# Altium footprint library lib_common.PcbLib: 13 footprints
Each footprint in its own frame and in the unit in brackets; x right, y up, seen from the top. Pads: shape width x height; smd on the part's side, far side on the other; paste and mask are expansions set on the pad; w line width, h text height; cw(c..) or ccw(c..) is an arc to the next point about the centre after c.
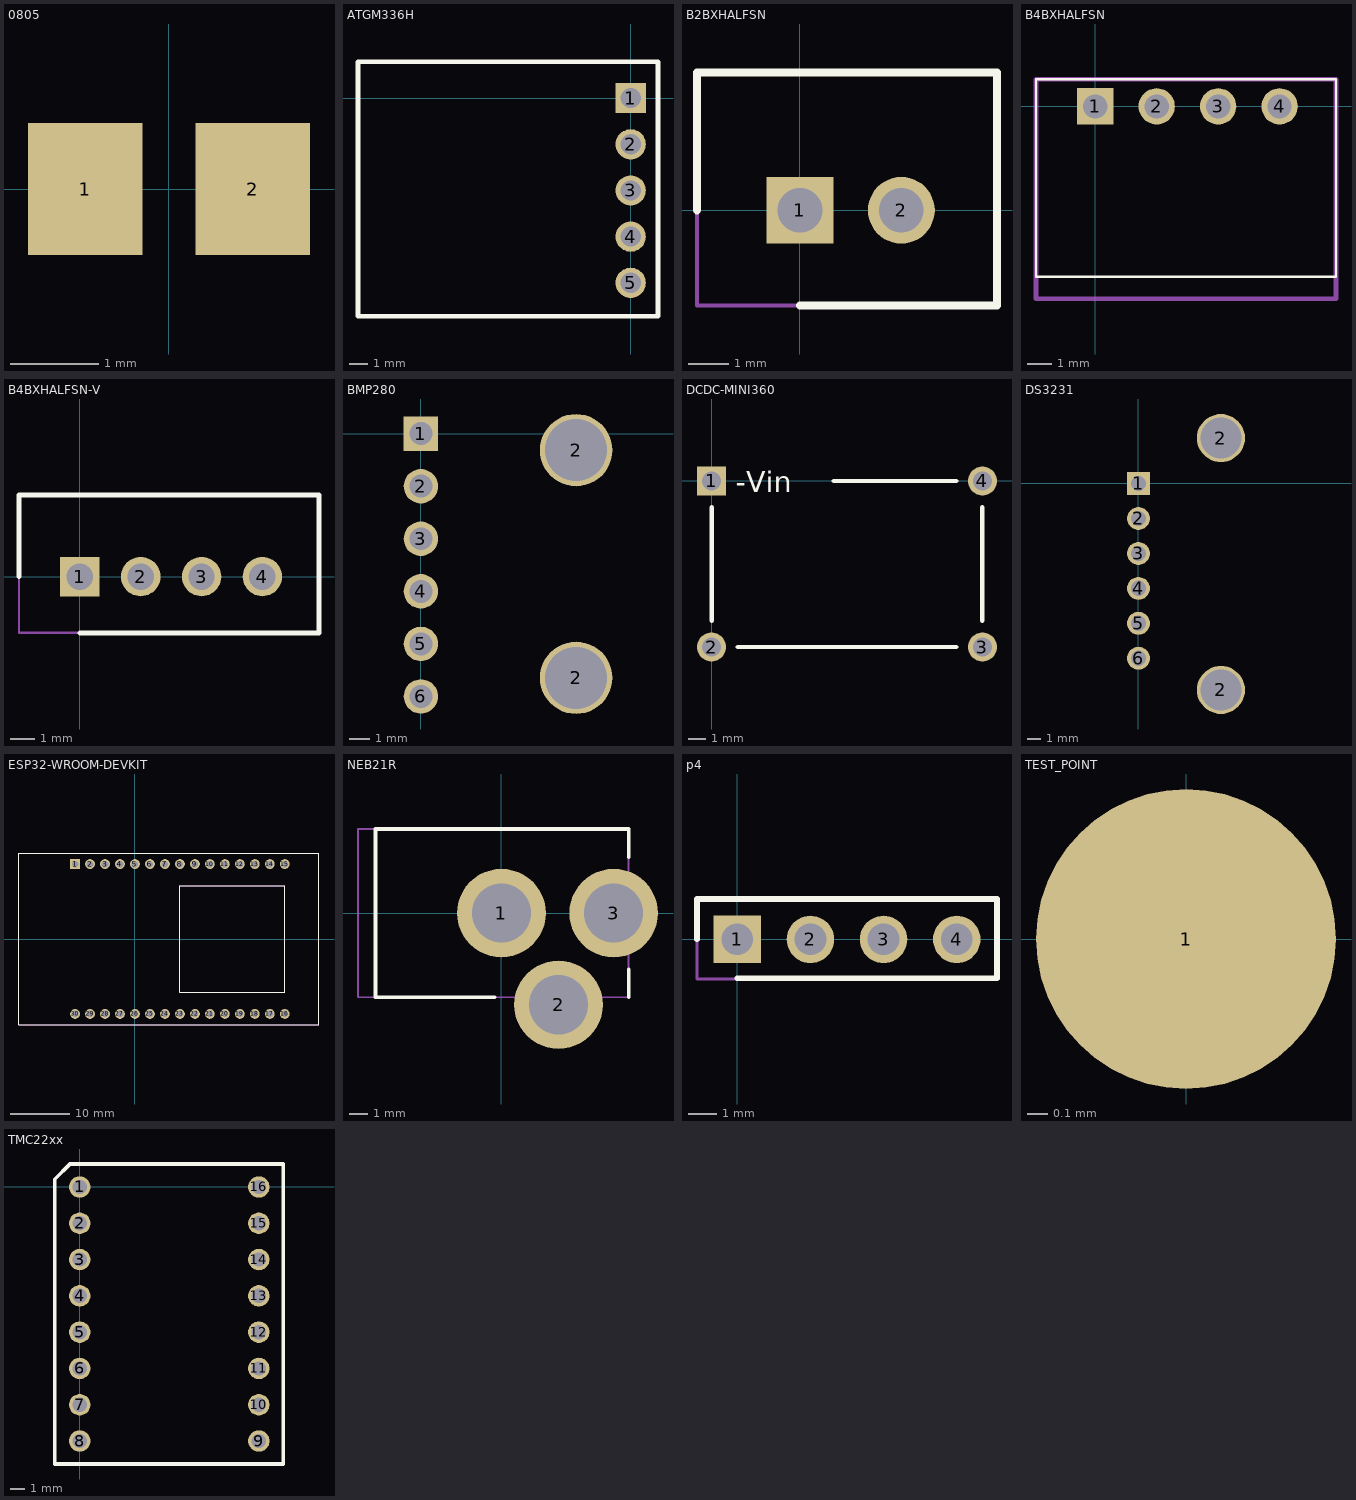
[diagram p0: the footprints below, top view; thin cyan lines are the x and y axes]

## 0805 [mm] "Chip Resistor; Body 2.0 x 1.3 mm (LxW typ)"
height 2.54
pads (2):
  rect 1.3x1.5 smd: 1(-0.95,0) 2(0.95,0)
3D body "User Library-RES_2013-0805.step": height 0.76, standoff 0, extent -1.15,-0.65 1.15,0.701

## ATGM336H [mm]
pads (5):
  rect 1.665x1.665 hole 1.11: 1(0,0)
  round 1.665 hole 1.11: 2(0,-2.54) 3(0,-5.08) 4(0,-7.62) 5(0,-10.16)
Top Overlay:
  lines w0.254: -15,-12 -15,2 1.5,2 1.5,-12 -15,-12

## B2BXHALFSN [mm]
pads (2):
  rect 1.65x1.65 hole 1.1: 1(0,0)
  round 1.65 hole 1.1: 2(2.5,0)
Top Overlay:
  lines w0.2: -2.54,0 -2.54,3.4 4.86,3.4 4.86,-2.35 0,-2.35
Mechanical 13:
  lines w0.1: -2.54,-2.35 4.86,-2.35 4.86,3.4 -2.54,3.4 -2.54,-2.35
3D body "B2B-XH-A_LF__SN_.stp": height 7, standoff -3.4, extent -2.54,-2.35 4.86,3.4

## B4BXHALFSN [mm]
pads (4):
  rect 1.5x1.5 hole 1: 1(0,0)
  round 1.5 hole 1: 2(2.54,0) 3(5.08,0) 4(7.62,0)
Top Overlay:
  lines w0.1: -2.45,-7.036 9.95,-7.036 9.95,1.118 -2.45,1.118 -2.45,-7.036
Mechanical 13:
  lines w0.2: -2.45,-7.95 9.95,-7.95 9.95,1.118 -2.45,1.118 -2.45,-7.95
3D body "JST - XH - Thru R - 4Pin - 2.54mm.stp": height 5.84, standoff -3.38, extent -2.388,-7.737 9.906,0.3

## B4BXHALFSN-V [mm]
pads (4):
  rect 1.65x1.65 hole 1.1: 1(0,0)
  round 1.65 hole 1.1: 2(2.54,0) 3(5.08,0) 4(7.62,0)
Top Overlay:
  lines w0.2: -2.54,0 -2.54,3.4 9.982,3.4 9.982,-2.35 0,-2.35
Mechanical 13:
  lines w0.1: -2.54,-2.35 9.982,-2.35 9.982,3.4 -2.54,3.4 -2.54,-2.35
3D body "B4B-XH-A.STEP": height 7, standoff -3.4, extent -2.466,-2.321 9.934,3.429

## BMP280 [mm]
pads (8):
  rect 1.665x1.665 hole 1.11: 1(0,0)
  round 1.665 hole 1.11: 2(0,-2.54) 3(0,-5.08) 4(0,-7.62) 5(0,-10.16) 6(0,-12.7)
  round 3.5 hole 3: 2(7.5,-11.8) 2(7.5,-0.8)
3D body "bmp280_module.stp": height 6.07, standoff -6.63, extent -1.444,-13.924 9.556,1.316

## DCDC-MINI360 [mm]
pads (4):
  rect 1.665x1.665 hole 1.11: 1(0,0)
  round 1.665 hole 1.11: 2(0,-9.5) 3(15.5,-9.5) 4(15.5,0)
Top Overlay:
  lines w0.254: 0,-8 0,-1.5 ; 1.5,-9.5 14,-9.5 ; 7,0 14,0 ; 15.5,-8 15.5,-1.5
  text "-Vin" at 1.372,-0.635 h1.2
3D body "dsn-mini-360.step": height 7.2, standoff -4.83, extent -1.228,-10.549 16.772,1.101

## DS3231 [mm]
pads (8):
  rect 1.665x1.665 hole 1.11: 1(0,0)
  round 1.665 hole 1.11: 2(0,-2.54) 3(0,-5.08) 4(0,-7.62) 5(0,-10.16) 6(0,-12.7)
  round 3.5 hole 3: 2(6,-15) 2(6,3.3)
3D body "DS3231_HW_84.step": height 13.15, standoff 0.1, extent -2.007,-17.451 35.993,4.7

## ESP32-WROOM-DEVKIT [mm]
pads (30):
  rect 1.665x1.665 hole 1.11: 1(-10.16,12.7)
  round 1.665 hole 1.11: 2(-7.62,12.7) 3(-5.08,12.7) 4(-2.54,12.7) 5(0,12.7) 6(2.54,12.7) 7(5.08,12.7) 8(7.62,12.7) 9(10.16,12.7) 10(12.7,12.7) 11(15.24,12.7) 12(17.78,12.7) 13(20.32,12.7) 14(22.86,12.7) 15(25.4,12.7) 16(25.4,-12.7) 17(22.86,-12.7) 18(20.32,-12.7) 19(17.78,-12.7) 20(15.24,-12.7) 21(12.7,-12.7) 22(10.16,-12.7) 23(7.62,-12.7) 24(5.08,-12.7) 25(2.54,-12.7) 26(0,-12.7) 27(-2.54,-12.7) 28(-5.08,-12.7) 29(-7.62,-12.7) 30(-10.16,-12.7)
Top Overlay:
  lines w0.1: -19.66,-14.5 -19.66,14.5 31.2,14.5 31.2,-14.5 -19.66,-14.5
  lines w0.2: 7.62,-9 25.4,-9 25.4,9 7.62,9 7.62,-9
Mechanical 13:
  lines w0.2: -19.66,-14.5 -19.66,14.5 31.2,14.5 31.2,-14.5 -19.66,-14.5 ; 7.62,-9 25.4,-9 25.4,9 7.62,9 7.62,-9
3D body "ESP-WROOM32.STEP": height 6.8, standoff -5.6, extent -20.055,-14.199 30.875,14.301

## NEB21R [mm]
pads (3):
  round 4.74 hole 3.16: 1(0,0) 2(3.05,-4.9) 3(6,0)
Top Overlay:
  lines w0.2: -6.731,-4.5 -6.731,4.496 6.8,4.496 ; -6.731,-4.496 -0.356,-4.496 ; 6.8,-4.5 6.8,-3 ; 6.8,3 6.8,4.5
Mechanical 13:
  lines w0.1: -7.671,-4.5 6.8,-4.5 6.8,4.5 -7.671,4.5 -7.671,-4.5
3D body "JACK ALIM.STEP": height 10.8, standoff -3.6, extent -7.391,-5.129 7.259,4.571

## p4 [mm]
pads (4):
  rect 1.65x1.65 hole 1.1: 1(0,0)
  round 1.65 hole 1.1: 2(2.54,0) 3(5.08,0) 4(7.62,0)
Top Overlay:
  lines w0.2: -1.397,0 -1.397,1.397 9.017,1.397 9.017,-1.346 0,-1.346
Mechanical 13:
  lines w0.1: -1.397,-1.372 9.017,-1.372 9.017,1.397 -1.397,1.397 -1.397,-1.372

## TEST_POINT [mm]
height 2.54
pads (1):
  round 1.5 smd: 1(0,0)

## TMC22xx [mm]
pads (16):
  round 1.5 hole 1: 1(0,0) 2(0,-2.54) 3(0,-5.08) 4(0,-7.62) 5(0,-10.16) 6(0,-12.7) 7(0,-15.24) 8(0,-17.78) 9(12.54,-17.78) 10(12.54,-15.24) 11(12.54,-12.7) 12(12.54,-10.16) 13(12.54,-7.62) 14(12.54,-5.08) 15(12.54,-2.54) 16(12.54,0)
Top Overlay:
  lines w0.254: -1.75,-19.39 14.25,-19.39 14.25,1.61 -0.676,1.61 -1.75,0.536 -1.75,-19.39
3D body "BTT TMC2209-V1.2.STEP": height 16.29, standoff -5.84, extent -1.372,-19.101 13.868,1.219